# Altium footprint library PcbLib2.PcbLib: 13 footprints
Each footprint in its own frame and in the unit in brackets; x right, y up, seen from the top. Pads: shape width x height; smd on the part's side, far side on the other; paste and mask are expansions set on the pad; w line width, h text height; cw(c..) or ccw(c..) is an arc to the next point about the centre after c.
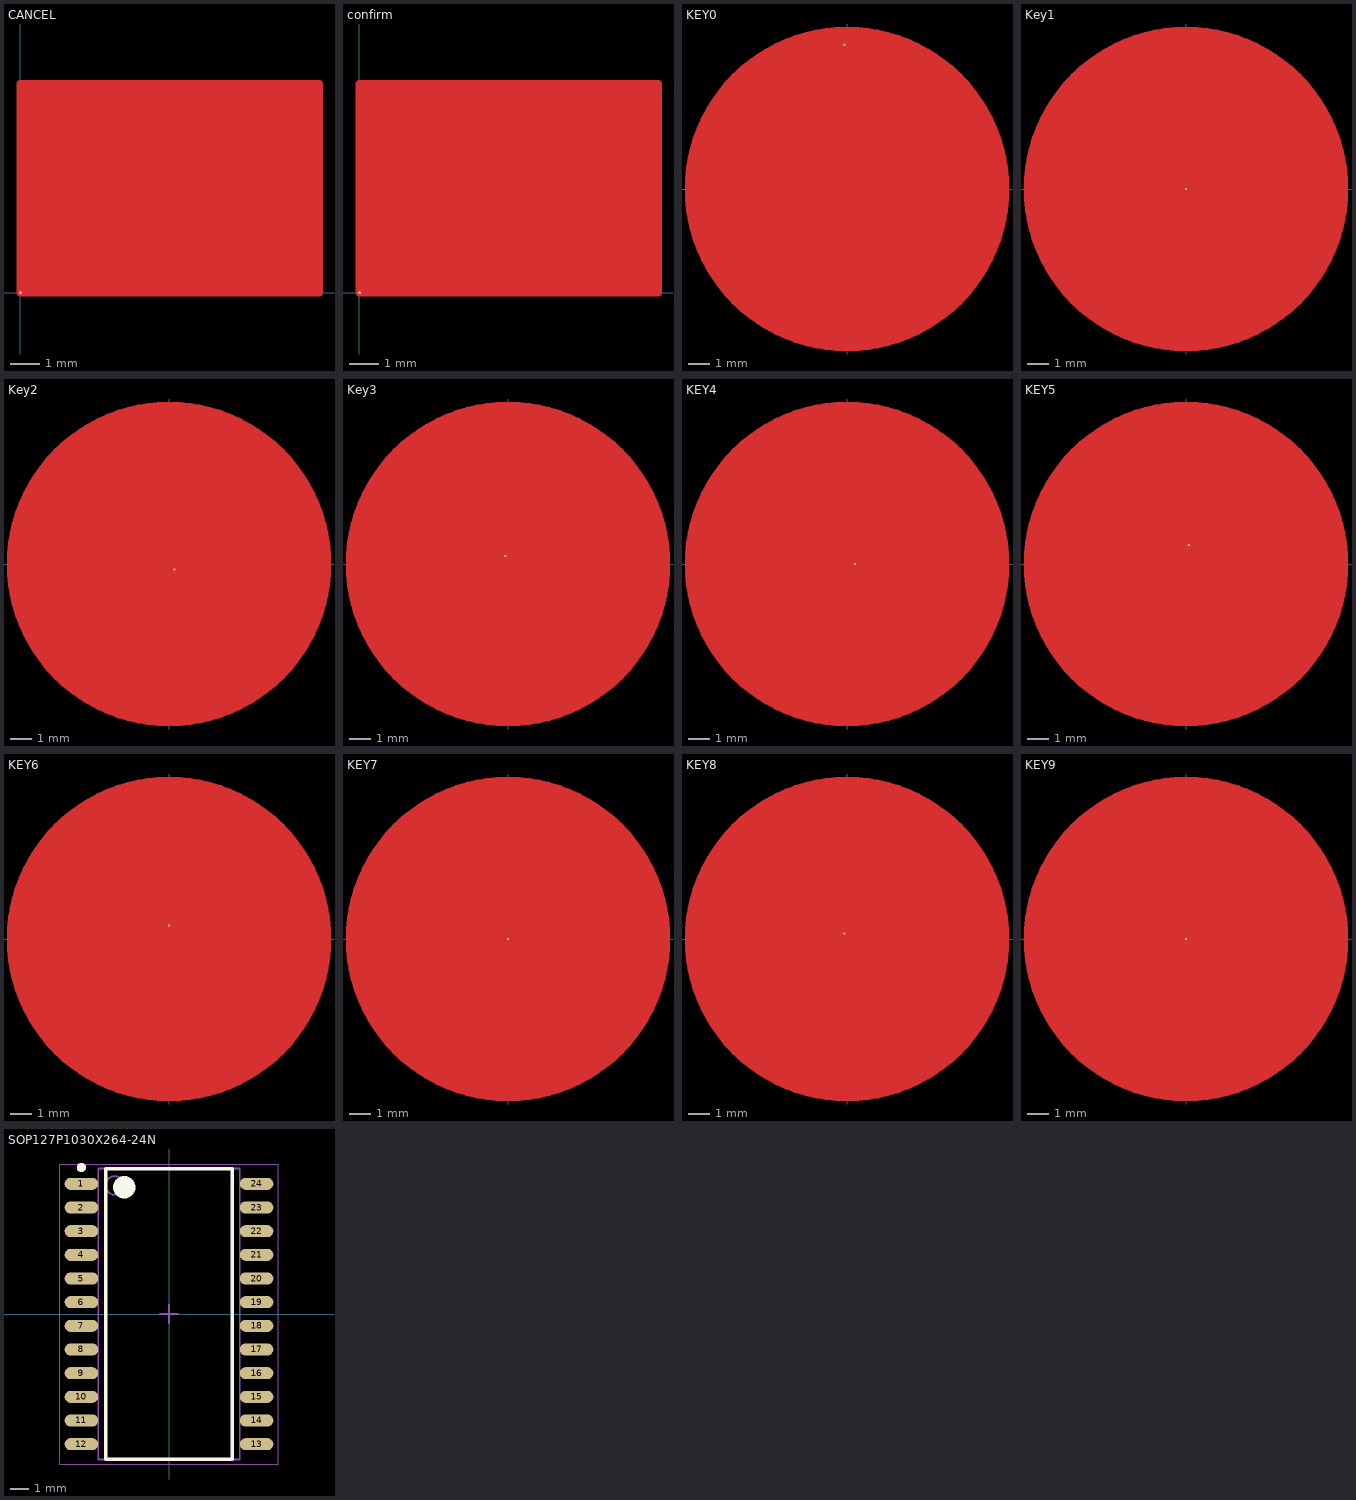
[diagram p0: the footprints below, top view; thin cyan lines are the x and y axes]

## CANCEL [mm]
pads (1):
  round 0.1 smd mask+0.051: 1(0,0)
Top Layer:
  region: 0,0 0,7 10,7 10,0
  lines w0.254: 0,0 0,7 10,7 10,0 0,0
Top Solder:
  lines w0.254: 0,0 10,0 10,7 0,7 0,0
  text "清零" at 0.259,1.916 h5

## confirm [mm]
pads (1):
  round 0.1 smd mask+0.051: 1(0,0)
Top Layer:
  region: 0,0 0,7 10,7 10,0
  lines w0.254: 0,0 10,0 10,7 0,7 0,0
Top Solder:
  lines w0.254: 0,0 10,0 10,7 0,7 0,0
  text "确认" at 0.259,1.879 h5

## KEY0 [mm]
pads (1):
  round 0.1 smd mask+0.051: 1(-0.127,6.731)
Top Layer:
  circle w1.143: c0,0 r7
  region: 0,-7 -0.344,-7 -1.028,-6.933 -1.703,-6.798 -2.361,-6.599 -2.996,-6.336 -3.603,-6.011 -4.175,-5.629 -4.707,-5.193 -5.193,-4.707 -5.629,-4.175 -6.011,-3.603 -6.336,-2.996 -6.599,-2.361 -6.798,-1.703 -6.933,-1.028 -7,-0.344 -7,0 -7,0.344 -6.933,1.028 -6.798,1.703 -6.599,2.361 -6.336,2.996 -6.011,3.603 -5.629,4.175 -5.193,4.707 -4.707,5.193 -4.175,5.629 -3.603,6.011 -2.996,6.336 -2.361,6.599 -1.703,6.798 -1.028,6.933 -0.344,7 0,7 0.344,7 1.028,6.933 1.703,6.798 2.361,6.599 2.996,6.336 3.603,6.011 4.175,5.629 4.707,5.193 5.193,4.707 5.629,4.175 6.011,3.603 6.336,2.996 6.599,2.361 6.798,1.703 6.933,1.028 7,0.344 7,0 7,-0.344 6.933,-1.028 6.798,-1.703 6.599,-2.361 6.336,-2.996 6.011,-3.603 5.629,-4.175 5.193,-4.707 4.707,-5.193 4.175,-5.629 3.603,-6.011 2.996,-6.336 2.361,-6.599 1.703,-6.798 1.028,-6.933 0.344,-7
Top Solder:
  circle w1.143: c0,0 r7
  text "0" at -2.159,-2.928 h10

## Key1 [mm]
pads (1):
  round 0.1 smd mask+0.051: 1(0,0)
Top Layer:
  circle w1.143: c0,0 r7
  region: 0,-7 -0.344,-7 -1.028,-6.933 -1.703,-6.798 -2.361,-6.599 -2.996,-6.336 -3.603,-6.011 -4.175,-5.629 -4.707,-5.193 -5.193,-4.707 -5.629,-4.175 -6.011,-3.603 -6.336,-2.996 -6.599,-2.361 -6.798,-1.703 -6.933,-1.028 -7,-0.344 -7,0 -7,0.344 -6.933,1.028 -6.798,1.703 -6.599,2.361 -6.336,2.996 -6.011,3.603 -5.629,4.175 -5.193,4.707 -4.707,5.193 -4.175,5.629 -3.603,6.011 -2.996,6.336 -2.361,6.599 -1.703,6.798 -1.028,6.933 -0.344,7 0,7 0.344,7 1.028,6.933 1.703,6.798 2.361,6.599 2.996,6.336 3.603,6.011 4.175,5.629 4.707,5.193 5.193,4.707 5.629,4.175 6.011,3.603 6.336,2.996 6.599,2.361 6.798,1.703 6.933,1.028 7,0.344 7,0 7,-0.344 6.933,-1.028 6.798,-1.703 6.599,-2.361 6.336,-2.996 6.011,-3.603 5.629,-4.175 5.193,-4.707 4.707,-5.193 4.175,-5.629 3.603,-6.011 2.996,-6.336 2.361,-6.599 1.703,-6.798 1.028,-6.933 0.344,-7
Top Solder:
  circle w1.143: c0,0 r7
  text "1" at -2.159,-3.048 h10

## Key2 [mm]
pads (1):
  round 0.1 smd mask+0.051: 1(0.254,-0.254)
Top Layer:
  circle w1.143: c0,0 r7
  region: 0,-7 -0.344,-7 -1.028,-6.933 -1.703,-6.798 -2.361,-6.599 -2.996,-6.336 -3.603,-6.011 -4.175,-5.629 -4.707,-5.193 -5.193,-4.707 -5.629,-4.175 -6.011,-3.603 -6.336,-2.996 -6.599,-2.361 -6.798,-1.703 -6.933,-1.028 -7,-0.344 -7,0 -7,0.344 -6.933,1.028 -6.798,1.703 -6.599,2.361 -6.336,2.996 -6.011,3.603 -5.629,4.175 -5.193,4.707 -4.707,5.193 -4.175,5.629 -3.603,6.011 -2.996,6.336 -2.361,6.599 -1.703,6.798 -1.028,6.933 -0.344,7 0,7 0.344,7 1.028,6.933 1.703,6.798 2.361,6.599 2.996,6.336 3.603,6.011 4.175,5.629 4.707,5.193 5.193,4.707 5.629,4.175 6.011,3.603 6.336,2.996 6.599,2.361 6.798,1.703 6.933,1.028 7,0.344 7,0 7,-0.344 6.933,-1.028 6.798,-1.703 6.599,-2.361 6.336,-2.996 6.011,-3.603 5.629,-4.175 5.193,-4.707 4.707,-5.193 4.175,-5.629 3.603,-6.011 2.996,-6.336 2.361,-6.599 1.703,-6.798 1.028,-6.933 0.344,-7
Top Solder:
  circle w1.143: c0,0 r7
  text "2" at -2.159,-3.048 h10

## Key3 [mm]
pads (1):
  round 0.1 smd mask+0.051: 1(-0.127,0.381)
Top Layer:
  circle w1.143: c0,0 r7
  region: 0,-7 -0.344,-7 -1.028,-6.933 -1.703,-6.798 -2.361,-6.599 -2.996,-6.336 -3.603,-6.011 -4.175,-5.629 -4.707,-5.193 -5.193,-4.707 -5.629,-4.175 -6.011,-3.603 -6.336,-2.996 -6.599,-2.361 -6.798,-1.703 -6.933,-1.028 -7,-0.344 -7,0 -7,0.344 -6.933,1.028 -6.798,1.703 -6.599,2.361 -6.336,2.996 -6.011,3.603 -5.629,4.175 -5.193,4.707 -4.707,5.193 -4.175,5.629 -3.603,6.011 -2.996,6.336 -2.361,6.599 -1.703,6.798 -1.028,6.933 -0.344,7 0,7 0.344,7 1.028,6.933 1.703,6.798 2.361,6.599 2.996,6.336 3.603,6.011 4.175,5.629 4.707,5.193 5.193,4.707 5.629,4.175 6.011,3.603 6.336,2.996 6.599,2.361 6.798,1.703 6.933,1.028 7,0.344 7,0 7,-0.344 6.933,-1.028 6.798,-1.703 6.599,-2.361 6.336,-2.996 6.011,-3.603 5.629,-4.175 5.193,-4.707 4.707,-5.193 4.175,-5.629 3.603,-6.011 2.996,-6.336 2.361,-6.599 1.703,-6.798 1.028,-6.933 0.344,-7
Top Solder:
  circle w1.143: c0,0 r7
  text "3" at -2.159,-2.928 h10

## KEY4 [mm]
pads (1):
  round 0.1 smd mask+0.051: 1(0.381,0)
Top Layer:
  circle w1.143: c0,0 r7
  region: 0,-7 -0.344,-7 -1.028,-6.933 -1.703,-6.798 -2.361,-6.599 -2.996,-6.336 -3.603,-6.011 -4.175,-5.629 -4.707,-5.193 -5.193,-4.707 -5.629,-4.175 -6.011,-3.603 -6.336,-2.996 -6.599,-2.361 -6.798,-1.703 -6.933,-1.028 -7,-0.344 -7,0 -7,0.344 -6.933,1.028 -6.798,1.703 -6.599,2.361 -6.336,2.996 -6.011,3.603 -5.629,4.175 -5.193,4.707 -4.707,5.193 -4.175,5.629 -3.603,6.011 -2.996,6.336 -2.361,6.599 -1.703,6.798 -1.028,6.933 -0.344,7 0,7 0.344,7 1.028,6.933 1.703,6.798 2.361,6.599 2.996,6.336 3.603,6.011 4.175,5.629 4.707,5.193 5.193,4.707 5.629,4.175 6.011,3.603 6.336,2.996 6.599,2.361 6.798,1.703 6.933,1.028 7,0.344 7,0 7,-0.344 6.933,-1.028 6.798,-1.703 6.599,-2.361 6.336,-2.996 6.011,-3.603 5.629,-4.175 5.193,-4.707 4.707,-5.193 4.175,-5.629 3.603,-6.011 2.996,-6.336 2.361,-6.599 1.703,-6.798 1.028,-6.933 0.344,-7
Top Solder:
  circle w1.143: c0,0 r7
  text "4" at -2.6,-3.048 h10

## KEY5 [mm]
pads (1):
  round 0.1 smd mask+0.051: 1(0.127,0.889)
Top Layer:
  circle w1.143: c0,0 r7
  region: 0,-7 -0.344,-7 -1.028,-6.933 -1.703,-6.798 -2.361,-6.599 -2.996,-6.336 -3.603,-6.011 -4.175,-5.629 -4.707,-5.193 -5.193,-4.707 -5.629,-4.175 -6.011,-3.603 -6.336,-2.996 -6.599,-2.361 -6.798,-1.703 -6.933,-1.028 -7,-0.344 -7,0 -7,0.344 -6.933,1.028 -6.798,1.703 -6.599,2.361 -6.336,2.996 -6.011,3.603 -5.629,4.175 -5.193,4.707 -4.707,5.193 -4.175,5.629 -3.603,6.011 -2.996,6.336 -2.361,6.599 -1.703,6.798 -1.028,6.933 -0.344,7 0,7 0.344,7 1.028,6.933 1.703,6.798 2.361,6.599 2.996,6.336 3.603,6.011 4.175,5.629 4.707,5.193 5.193,4.707 5.629,4.175 6.011,3.603 6.336,2.996 6.599,2.361 6.798,1.703 6.933,1.028 7,0.344 7,0 7,-0.344 6.933,-1.028 6.798,-1.703 6.599,-2.361 6.336,-2.996 6.011,-3.603 5.629,-4.175 5.193,-4.707 4.707,-5.193 4.175,-5.629 3.603,-6.011 2.996,-6.336 2.361,-6.599 1.703,-6.798 1.028,-6.933 0.344,-7
Top Solder:
  circle w1.143: c0,0 r7
  text "5" at -2.159,-2.928 h10

## KEY6 [mm]
pads (1):
  round 0.1 smd mask+0.051: 1(0,0.635)
Top Layer:
  circle w1.143: c0,0 r7
  region: 0,-7 -0.344,-7 -1.028,-6.933 -1.703,-6.798 -2.361,-6.599 -2.996,-6.336 -3.603,-6.011 -4.175,-5.629 -4.707,-5.193 -5.193,-4.707 -5.629,-4.175 -6.011,-3.603 -6.336,-2.996 -6.599,-2.361 -6.798,-1.703 -6.933,-1.028 -7,-0.344 -7,0 -7,0.344 -6.933,1.028 -6.798,1.703 -6.599,2.361 -6.336,2.996 -6.011,3.603 -5.629,4.175 -5.193,4.707 -4.707,5.193 -4.175,5.629 -3.603,6.011 -2.996,6.336 -2.361,6.599 -1.703,6.798 -1.028,6.933 -0.344,7 0,7 0.344,7 1.028,6.933 1.703,6.798 2.361,6.599 2.996,6.336 3.603,6.011 4.175,5.629 4.707,5.193 5.193,4.707 5.629,4.175 6.011,3.603 6.336,2.996 6.599,2.361 6.798,1.703 6.933,1.028 7,0.344 7,0 7,-0.344 6.933,-1.028 6.798,-1.703 6.599,-2.361 6.336,-2.996 6.011,-3.603 5.629,-4.175 5.193,-4.707 4.707,-5.193 4.175,-5.629 3.603,-6.011 2.996,-6.336 2.361,-6.599 1.703,-6.798 1.028,-6.933 0.344,-7
Top Solder:
  circle w1.143: c0,0 r7
  text "6" at -2.159,-2.928 h10

## KEY7 [mm]
pads (1):
  round 0.1 smd mask+0.051: 1(0,0)
Top Layer:
  circle w1.143: c0,0 r7
  region: 0,-7 -0.344,-7 -1.028,-6.933 -1.703,-6.798 -2.361,-6.599 -2.996,-6.336 -3.603,-6.011 -4.175,-5.629 -4.707,-5.193 -5.193,-4.707 -5.629,-4.175 -6.011,-3.603 -6.336,-2.996 -6.599,-2.361 -6.798,-1.703 -6.933,-1.028 -7,-0.344 -7,0 -7,0.344 -6.933,1.028 -6.798,1.703 -6.599,2.361 -6.336,2.996 -6.011,3.603 -5.629,4.175 -5.193,4.707 -4.707,5.193 -4.175,5.629 -3.603,6.011 -2.996,6.336 -2.361,6.599 -1.703,6.798 -1.028,6.933 -0.344,7 0,7 0.344,7 1.028,6.933 1.703,6.798 2.361,6.599 2.996,6.336 3.603,6.011 4.175,5.629 4.707,5.193 5.193,4.707 5.629,4.175 6.011,3.603 6.336,2.996 6.599,2.361 6.798,1.703 6.933,1.028 7,0.344 7,0 7,-0.344 6.933,-1.028 6.798,-1.703 6.599,-2.361 6.336,-2.996 6.011,-3.603 5.629,-4.175 5.193,-4.707 4.707,-5.193 4.175,-5.629 3.603,-6.011 2.996,-6.336 2.361,-6.599 1.703,-6.798 1.028,-6.933 0.344,-7
Top Solder:
  circle w1.143: c0,0 r7
  text "7" at -2.159,-3.048 h10

## KEY8 [mm]
pads (1):
  round 0.1 smd mask+0.051: 1(-0.127,0.254)
Top Layer:
  circle w1.143: c0,0 r7
  region: 0,-7 -0.344,-7 -1.028,-6.933 -1.703,-6.798 -2.361,-6.599 -2.996,-6.336 -3.603,-6.011 -4.175,-5.629 -4.707,-5.193 -5.193,-4.707 -5.629,-4.175 -6.011,-3.603 -6.336,-2.996 -6.599,-2.361 -6.798,-1.703 -6.933,-1.028 -7,-0.344 -7,0 -7,0.344 -6.933,1.028 -6.798,1.703 -6.599,2.361 -6.336,2.996 -6.011,3.603 -5.629,4.175 -5.193,4.707 -4.707,5.193 -4.175,5.629 -3.603,6.011 -2.996,6.336 -2.361,6.599 -1.703,6.798 -1.028,6.933 -0.344,7 0,7 0.344,7 1.028,6.933 1.703,6.798 2.361,6.599 2.996,6.336 3.603,6.011 4.175,5.629 4.707,5.193 5.193,4.707 5.629,4.175 6.011,3.603 6.336,2.996 6.599,2.361 6.798,1.703 6.933,1.028 7,0.344 7,0 7,-0.344 6.933,-1.028 6.798,-1.703 6.599,-2.361 6.336,-2.996 6.011,-3.603 5.629,-4.175 5.193,-4.707 4.707,-5.193 4.175,-5.629 3.603,-6.011 2.996,-6.336 2.361,-6.599 1.703,-6.798 1.028,-6.933 0.344,-7
Top Solder:
  circle w1.143: c0,0 r7
  text "8" at -2.159,-2.928 h10

## KEY9 [mm]
pads (1):
  round 0.1 smd mask+0.051: 1(0,0)
Top Layer:
  circle w1.143: c0,0 r7
  region: 0,-7 -0.344,-7 -1.028,-6.933 -1.703,-6.798 -2.361,-6.599 -2.996,-6.336 -3.603,-6.011 -4.175,-5.629 -4.707,-5.193 -5.193,-4.707 -5.629,-4.175 -6.011,-3.603 -6.336,-2.996 -6.599,-2.361 -6.798,-1.703 -6.933,-1.028 -7,-0.344 -7,0 -7,0.344 -6.933,1.028 -6.798,1.703 -6.599,2.361 -6.336,2.996 -6.011,3.603 -5.629,4.175 -5.193,4.707 -4.707,5.193 -4.175,5.629 -3.603,6.011 -2.996,6.336 -2.361,6.599 -1.703,6.798 -1.028,6.933 -0.344,7 0,7 0.344,7 1.028,6.933 1.703,6.798 2.361,6.599 2.996,6.336 3.603,6.011 4.175,5.629 4.707,5.193 5.193,4.707 5.629,4.175 6.011,3.603 6.336,2.996 6.599,2.361 6.798,1.703 6.933,1.028 7,0.344 7,0 7,-0.344 6.933,-1.028 6.798,-1.703 6.599,-2.361 6.336,-2.996 6.011,-3.603 5.629,-4.175 5.193,-4.707 4.707,-5.193 4.175,-5.629 3.603,-6.011 2.996,-6.336 2.361,-6.599 1.703,-6.798 1.028,-6.933 0.344,-7
Top Solder:
  circle w1.143: c0,0 r7
  text "9" at -2.159,-2.928 h10

## SOP127P1030X264-24N [mm] "SOP, 24-Leads, Body 15.40x7.50mm, Pitch 1.27mm, IPC Medium Density"
height 2.64
pads (24):
  oval 1.8x0.65 smd: 1(-4.7,6.985) 2(-4.7,5.715) 3(-4.7,4.445) 4(-4.7,3.175) 5(-4.7,1.905) 6(-4.7,0.635) 7(-4.7,-0.635) 8(-4.7,-1.905) 9(-4.7,-3.175) 10(-4.7,-4.445) 11(-4.7,-5.715) 12(-4.7,-6.985) 13(4.7,-6.985) 14(4.7,-5.715) 15(4.7,-4.445) 16(4.7,-3.175) 17(4.7,-1.905) 18(4.7,-0.635) 19(4.7,0.635) 20(4.7,1.905) 21(4.7,3.175) 22(4.7,4.445) 23(4.7,5.715) 24(4.7,6.985)
Top Overlay:
  circle w0.25: c-4.7,7.86 r0.125
  circle w0.6: c-2.4,6.8 r0.3
  lines w0.2: -3.4,-7.8 -3.4,7.8 3.4,7.8 3.4,-7.8 -3.4,-7.8
Mechanical 13:
  circle w0.1: c-2.9,6.9 r0.5
  lines w0.1: -3.8,-7.8 -3.8,7.8 3.8,7.8 3.8,-7.8 -3.8,-7.8
Mechanical 15:
  lines w0.05: -5.85,-8.05 -5.85,8.05 5.85,8.05 5.85,-8.05 -5.85,-8.05
  lines w0.1: -0.5,0 0.5,0 ; 0,-0.5 0,0.5
3D body "SOP127P1030X264-24N.step": height 2.64, standoff 0, extent -5.15,-7.8 5.15,7.8